# Altium footprint library Connector.PcbLib: 148 footprints (part 4 of 10)
Each footprint in its own frame and in the unit in brackets; x right, y up, seen from the top. Pads: shape width x height; smd on the part's side, far side on the other; paste and mask are expansions set on the pad; w line width, h text height; cw(c..) or ccw(c..) is an arc to the next point about the centre after c.
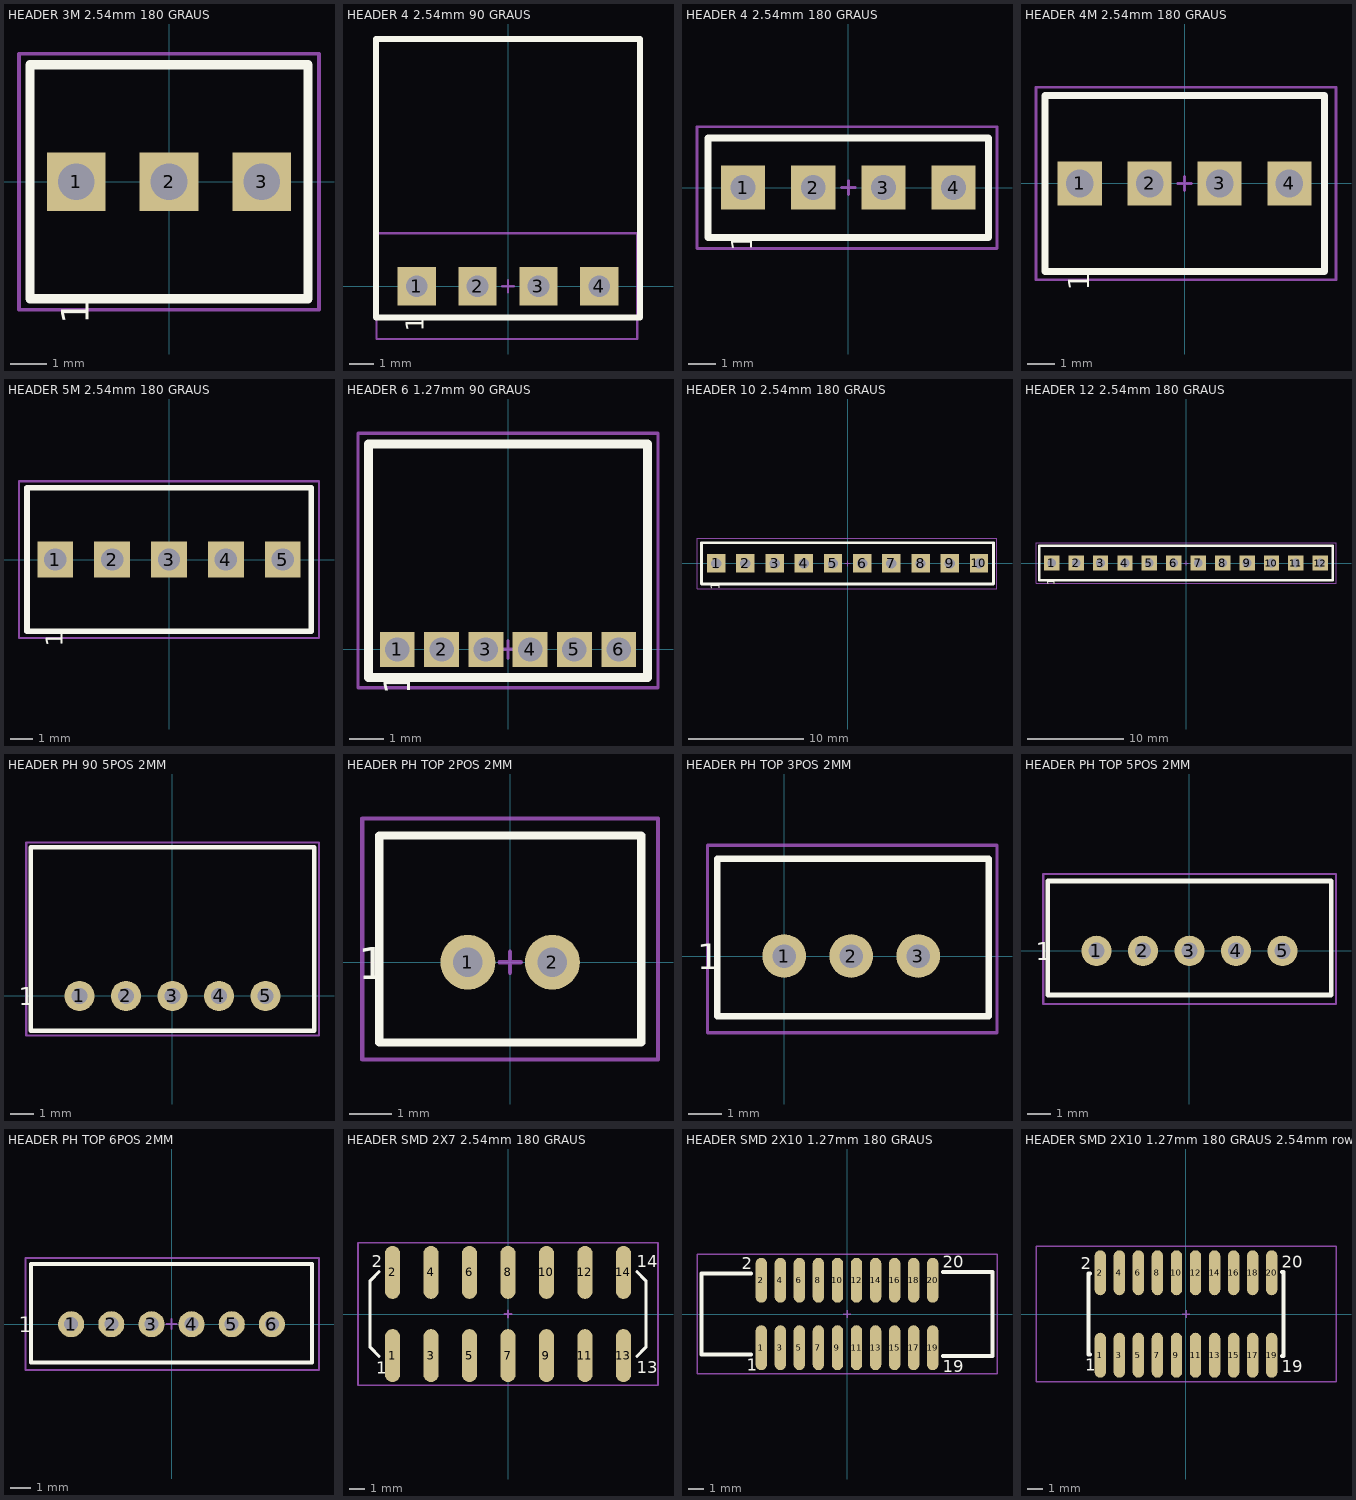
[diagram p3: the footprints below, top view; thin cyan lines are the x and y axes]

## HEADER 3M 2.54mm 180 GRAUS [mm] "HEADER 3M 2.54mm 180 GRAUS"
pads (3):
  rect 1.6x1.6 hole 1: 1(-2.54,0) 2(0,0) 3(2.54,0)
Top Overlay:
  lines w0.254: -3.8,-3.2 3.8,-3.2 3.8,3.2 -3.8,3.2 -3.8,-3.2
  text "1" at -2.2,-3.9 h0.76
Mechanical 15:
  lines w0.1: -0.25,0 0.25,0 ; 0,-0.25 0,0.25 ; -4.1,-3.5 -4.1,3.5 4.1,3.5 4.1,-3.5 -4.1,-3.5
3D body "HEADER 3M 2.54mm 180 GRAUS.STEP": height 10.68, standoff -3.54, extent -3.81,-3.251 3.81,3.099

## HEADER 4 2.54mm 90 GRAUS [mm] "HEADER 4 2.54mm 90 GRAUS"
pads (4):
  rect 1.6x1.6 hole 0.9: 1(-3.81,0) 2(-1.27,0) 3(1.27,0) 4(3.81,0)
Top Overlay:
  lines w0.254: -5.5,-1.3 5.5,-1.3 5.5,10.3 -5.5,10.3 -5.5,-1.3
  text "1" at -3.5,-1.9 h0.76
Mechanical 15:
  lines w0.1: -0.25,0 0.25,0 ; 0,-0.25 0,0.25 ; -5.48,-2.2 -5.48,2.2 5.38,2.2 5.38,-2.2 -5.48,-2.2
3D body "_ _ _C041LGBN-RC.STEP": height 2.6, standoff -3.09, extent -5.325,-0.2 5.335,10.1

## HEADER 4 2.54mm 180 GRAUS [mm] "HEADER 4 2.54mm 180 GRAUS"
height 8.64
pads (4):
  rect 1.6x1.6 hole 0.9: 1(-3.81,0) 2(-1.27,0) 3(1.27,0) 4(3.81,0)
Top Overlay:
  lines w0.254: -5.08,-1.8 5.08,-1.8 5.08,1.8 -5.08,1.8 -5.08,-1.8
  text "1" at -3.48,-2.3 h0.76
Mechanical 15:
  lines w0.1: -0.25,0 0.25,0 ; 0,-0.25 0,0.25 ; -5.48,-2.2 -5.48,2.2 5.38,2.2 5.38,-2.2 -5.48,-2.2
3D body "Peça2.STEP": height 8.7, standoff -2.86, extent -5.08,-1.778 5.08,1.778

## HEADER 4M 2.54mm 180 GRAUS [mm] "HEADER 4M 2.54mm 180 GRAUS"
pads (4):
  rect 1.6x1.6 hole 1: 1(-3.81,0) 2(-1.27,0) 3(1.27,0) 4(3.81,0)
Top Overlay:
  lines w0.254: -5.07,-3.2 5.08,-3.2 5.08,3.2 -5.07,3.2 -5.07,-3.2
  text "1" at -3.47,-3.9 h0.76
Mechanical 15:
  lines w0.1: -0.25,0 0.25,0 ; 0,-0.25 0,0.25 ; -5.4,-3.5 -5.4,3.5 5.5,3.5 5.5,-3.5 -5.4,-3.5
3D body "HEADER 4M 2.54mm 180 GRAUS.STEP": height 10.78, standoff -3.44, extent -5.08,-3.251 5.08,3.099

## HEADER 5M 2.54mm 180 GRAUS [mm] "HEADER 5M 2.54mm 180 GRAUS"
pads (5):
  rect 1.6x1.6 hole 1: 1(-5.08,0) 2(-2.54,0) 3(0,0) 4(2.54,0) 5(5.08,0)
Top Overlay:
  lines w0.254: -6.34,-3.2 -6.34,3.2 6.35,3.2 6.35,-3.2 -6.34,-3.2
  text "1" at -4.74,-3.9 h0.76
Mechanical 15:
  lines w0.1: -0.25,0 0.25,0 ; 0,-0.25 0,0.25 ; -6.7,-3.5 6.7,-3.5 6.7,3.5 -6.7,3.5 -6.7,-3.5
3D body "HEADER 5M 2.54mm 180 GRAUS.STEP": height 10.78, standoff -3.44, extent -6.35,-3.251 6.35,3.099

## HEADER 6 1.27mm 90 GRAUS [mm] "HEADER 6 .50mil 90 GRAUS"
pads (6):
  rect 1x1 hole 0.7: 1(-3.175,0) 2(-1.905,0) 3(-0.635,0) 4(0.635,0) 5(1.905,0) 6(3.175,0)
Top Overlay:
  lines w0.254: -4,-0.8 4,-0.8 4,5.893 -4,5.893 -4,-0.8
  text "1" at -2.8,-1.3 h0.76
Mechanical 15:
  lines w0.1: -0.25,0 0.25,0 ; 0,-0.25 0,0.25 ; -4.3,-1.1 -4.3,6.2 4.3,6.2 4.3,-1.1 -4.3,-1.1
3D body "HEADER 6 50mil 90 GRAUS.STEP": height 1.34, standoff -1.93, extent -3.81,-0.229 3.81,5.721

## HEADER 10 2.54mm 180 GRAUS [mm] "HEADER 10 2.54mm 180 GRAUS"
height 8.64
pads (10):
  rect 1.6x1.6 hole 0.9: 1(-11.43,0) 2(-8.89,0) 3(-6.35,0) 4(-3.81,0) 5(-1.27,0) 6(1.27,0) 7(3.81,0) 8(6.35,0) 9(8.89,0) 10(11.43,0)
Top Overlay:
  lines w0.254: -12.7,-1.8 -12.7,1.8 12.7,1.8 12.7,-1.8 -12.7,-1.8
  text "1" at -11.1,-2.3 h0.76
Mechanical 15:
  lines w0.1: -0.25,0 0.25,0 ; 0,-0.25 0,0.25 ; -13.1,-2.2 -13.1,2.2 13,2.2 13,-2.2 -13.1,-2.2
3D body "HEADER 10 2.54mm 1800 GRAUS.stp": height 8.7, standoff -2.86, extent -12.7,-1.778 12.7,1.778

## HEADER 12 2.54mm 180 GRAUS [mm] "HEADER 12 2.54mm 180 GRAUS"
height 8.64
pads (12):
  rect 1.6x1.6 hole 0.9: 1(-13.97,0) 2(-11.43,0) 3(-8.89,0) 4(-6.35,0) 5(-3.81,0) 6(-1.27,0) 7(1.27,0) 8(3.81,0) 9(6.35,0) 10(8.89,0) 11(11.43,0) 12(13.97,0)
Top Overlay:
  lines w0.254: -15.24,-1.8 15.24,-1.8 15.24,1.8 -15.24,1.8 -15.24,-1.8
  text "1" at -13.64,-2.3 h0.76
Mechanical 15:
  lines w0.1: -0.25,0 0.25,0 ; 0,-0.25 0,0.25 ; -15.6,-2.1 -15.6,2.1 15.6,2.1 15.6,-2.1 -15.6,-2.1
3D body "HEADER 12 2.54mm 1800 GRAUS.stp": height 7, standoff -3.1, extent -15.24,-1.26 15.24,1.26

## HEADER PH 90 5POS 2MM [mm] "HEADER PH 90 5POS 2MM"
height 6
pads (5):
  round 1.3 hole 0.7: 1(-4,0) 2(-2,0) 3(0,0) 4(2,0) 5(4,0)
Top Overlay:
  lines w0.2: -6.1,-1.5 -6.1,6.4 6.1,6.4 6.1,-1.5 -2.5,-1.5 -6.1,-1.5
  text "1" at -6.6,-0.4 h0.76
Mechanical 15:
  lines w0.1: -0.25,0 0.25,0 ; 0,-0.25 0,0.25 ; -6.286,-1.7 6.3,-1.7 6.3,6.6 -6.286,6.6 -6.286,-1.7
3D body "S5B-PH-K-S.STEP": height 4.8, standoff -3.4, extent -5.95,-1.35 5.95,6.25

## HEADER PH TOP 2POS 2MM [mm] "HEADER PH TOP 2POS 2MM"
height 6
pads (2):
  round 1.3 hole 0.7: 1(-1,0) 2(1,0)
Top Overlay:
  lines w0.2: -3.1,-1.9 -3.1,3 3.1,3 3.1,-1.9 0.1,-1.9 -3.1,-1.9
  text "1" at -3.6,-0.4 h0.76
Mechanical 15:
  lines w0.1: -0.25,0 0.25,0 ; 0,-0.25 0,0.25 ; -3.5,-2.3 3.5,-2.3 3.5,3.4 -3.5,3.4 -3.5,-2.3
3D body "User Library-b2b-ph-ks-1.STEP": height 6, standoff -3, extent -2.95,-1.7 2.95,2.8

## HEADER PH TOP 3POS 2MM [mm] "HEADER PH TOP 3POS 2MM"
height 6
pads (3):
  round 1.3 hole 0.7: 1(0,0) 2(2,0) 3(4,0)
Top Overlay:
  lines w0.2: -2,-1.8 1,-1.8 6.1,-1.8 6.1,2.9 -2,2.9 -2,-1.8
  text "1" at -2.6,-0.4 h0.76
Mechanical 15:
  lines w0.1: 1.75,0 2.25,0 ; 2,-0.25 2,0.25 ; -2.286,-2.286 -2.286,3.302 6.35,3.302 6.35,-2.286 -2.286,-2.286
3D body "User Library-B3B-PH-K-S(LF)(SN).STEP": height 6.05, standoff -3.35, extent -1.95,-1.7 5.95,2.8

## HEADER PH TOP 5POS 2MM [mm] "HEADER PH TOP 5POS 2MM"
height 6
pads (5):
  round 1.3 hole 0.7: 1(-4,0) 2(-2,0) 3(0,0) 4(2,0) 5(4,0)
Top Overlay:
  lines w0.2: -6.1,-1.9 -6.1,3 6.1,3 6.1,-1.9 -2.9,-1.9 -6.1,-1.9
  text "1" at -6.6,-0.4 h0.76
Mechanical 15:
  lines w0.1: -0.25,0 0.25,0 ; 0,-0.25 0,0.25 ; -6.286,-2.286 6.3,-2.286 6.3,3.302 -6.286,3.302 -6.286,-2.286
3D body "B5B-PH-K-S.STEP": height 6, standoff -3.4, extent -5.95,-1.7 5.95,2.8

## HEADER PH TOP 6POS 2MM [mm] "HEADER PH TOP 3POS 2MM"
height 6
pads (6):
  round 1.3 hole 0.7: 1(-5,0) 2(-3,0) 3(-1,0) 4(1,0) 5(3,0) 6(5,0)
Top Overlay:
  lines w0.2: -7,-1.9 -3.9,-1.9 7,-1.9 7,3 -7,3 -7,-1.9
  text "1" at -7.6,-0.4 h0.76
Mechanical 15:
  lines w0.1: -0.25,0 0.25,0 ; 0,-0.25 0,0.25 ; -7.286,-2.286 -7.286,3.302 7.35,3.302 7.35,-2.286 -7.286,-2.286
3D body "Peça3.STEP": height 6, standoff -3.4, extent -6.95,-1.7 6.95,2.8

## HEADER SMD 2X7 2.54mm 180 GRAUS [mm]
height 9.65
pads (14):
  oval 1x3.5 smd: 1(-7.62,-2.75) 2(-7.62,2.75) 3(-5.08,-2.75) 4(-5.08,2.75) 5(-2.54,-2.75) 6(-2.54,2.75) 7(0,-2.75) 8(0,2.75) 9(2.54,-2.75) 10(2.54,2.75) 11(5.08,-2.75) 12(5.08,2.75) 13(7.62,-2.75) 14(7.62,2.75)
Top Overlay:
  lines w0.2: -8.5,-2.8 -9.1,-2.2 -9.1,2.2 -8.5,2.8 ; 8.5,-2.8 9.1,-2.2 9.1,2.2 8.5,2.8
  text "1" at -8.7,-3.95 h0.8
  text "2" at -9,3.1 h0.8
  text "13" at 8.5,-3.9 h0.8
  text "14" at 8.5,3.1 h0.8
Mechanical 15:
  lines w0.1: -0.25,0 0.25,0 ; 0,-0.25 0,0.25 ; -9.9,-4.7 9.9,-4.7 9.9,4.7 -9.9,4.7 -9.9,-4.7
3D body "TSM-107-01-L-DV-006.stp": height 9.65, standoff 0, extent -8.89,-3.848 8.89,3.848

## HEADER SMD 2X10 1.27mm 180 GRAUS [mm]
height 1.75
pads (20):
  oval 0.76x3 smd: 1(-5.715,-2.25) 2(-5.715,2.25) 3(-4.445,-2.25) 4(-4.445,2.25) 5(-3.175,-2.25) 6(-3.175,2.25) 7(-1.905,-2.25) 8(-1.905,2.25) 9(-0.635,-2.25) 10(-0.635,2.25) 11(0.635,-2.25) 12(0.635,2.25) 13(1.905,-2.25) 14(1.905,2.25) 15(3.175,-2.25) 16(3.175,2.25) 17(4.445,-2.25) 18(4.445,2.25) 19(5.715,-2.25) 20(5.715,2.25)
Top Overlay:
  lines w0.254: -6.4,-2.7 -9.7,-2.7 -9.7,2.7 -6.4,2.7 ; 6.4,-2.8 9.7,-2.8 9.7,2.8 6.4,2.8
  text "20" at 6.4,3.1 h0.8
  text "19" at 6.4,-3.9 h0.8
  text "2" at -7,3 h0.8
  text "1" at -6.7,-3.8 h0.8
Mechanical 15:
  lines w0.1: -0.25,0 0.25,0 ; 0,-0.25 0,0.25 ; -10,-4 10,-4 10,4 -10,4 -10,-4
3D body "3220-20-0300.STEP": height 5.6, standoff 0, extent -9.5,-2.75 9.5,2.75

## HEADER SMD 2X10 1.27mm 180 GRAUS 2.54mm row spacing [mm]
height 3.18
pads (20):
  oval 0.76x3 smd: 1(-5.715,-2.75) 2(-5.715,2.75) 3(-4.445,-2.75) 4(-4.445,2.75) 5(-3.175,-2.75) 6(-3.175,2.75) 7(-1.905,-2.75) 8(-1.905,2.75) 9(-0.635,-2.75) 10(-0.635,2.75) 11(0.635,-2.75) 12(0.635,2.75) 13(1.905,-2.75) 14(1.905,2.75) 15(3.175,-2.75) 16(3.175,2.75) 17(4.445,-2.75) 18(4.445,2.75) 19(5.715,-2.75) 20(5.715,2.75)
Top Overlay:
  lines w0.254: -6.4,-2.7 -6.5,-2.7 -6.5,2.7 -6.4,2.7 ; 6.4,-2.8 6.5,-2.8 6.5,2.8 6.4,2.8
  text "1" at -6.7,-3.8 h0.8
  text "2" at -7,3 h0.8
  text "19" at 6.4,-3.9 h0.8
  text "20" at 6.4,3.1 h0.8
Mechanical 15:
  lines w0.1: -0.25,0 0.25,0 ; 0,-0.25 0,0.25 ; -10,-4.5 10,-4.5 10,4.5 -10,4.5 -10,-4.5
3D body "FTR-110-03-G-D-06.stp": height 6.98, standoff 0, extent -6.35,-3.759 6.35,3.759